# Altium integrated library JMU智能车专用2.0.6.IntLib: 50 symbols
Pins are listed as number, name and electrical type; pins without a type are passive.

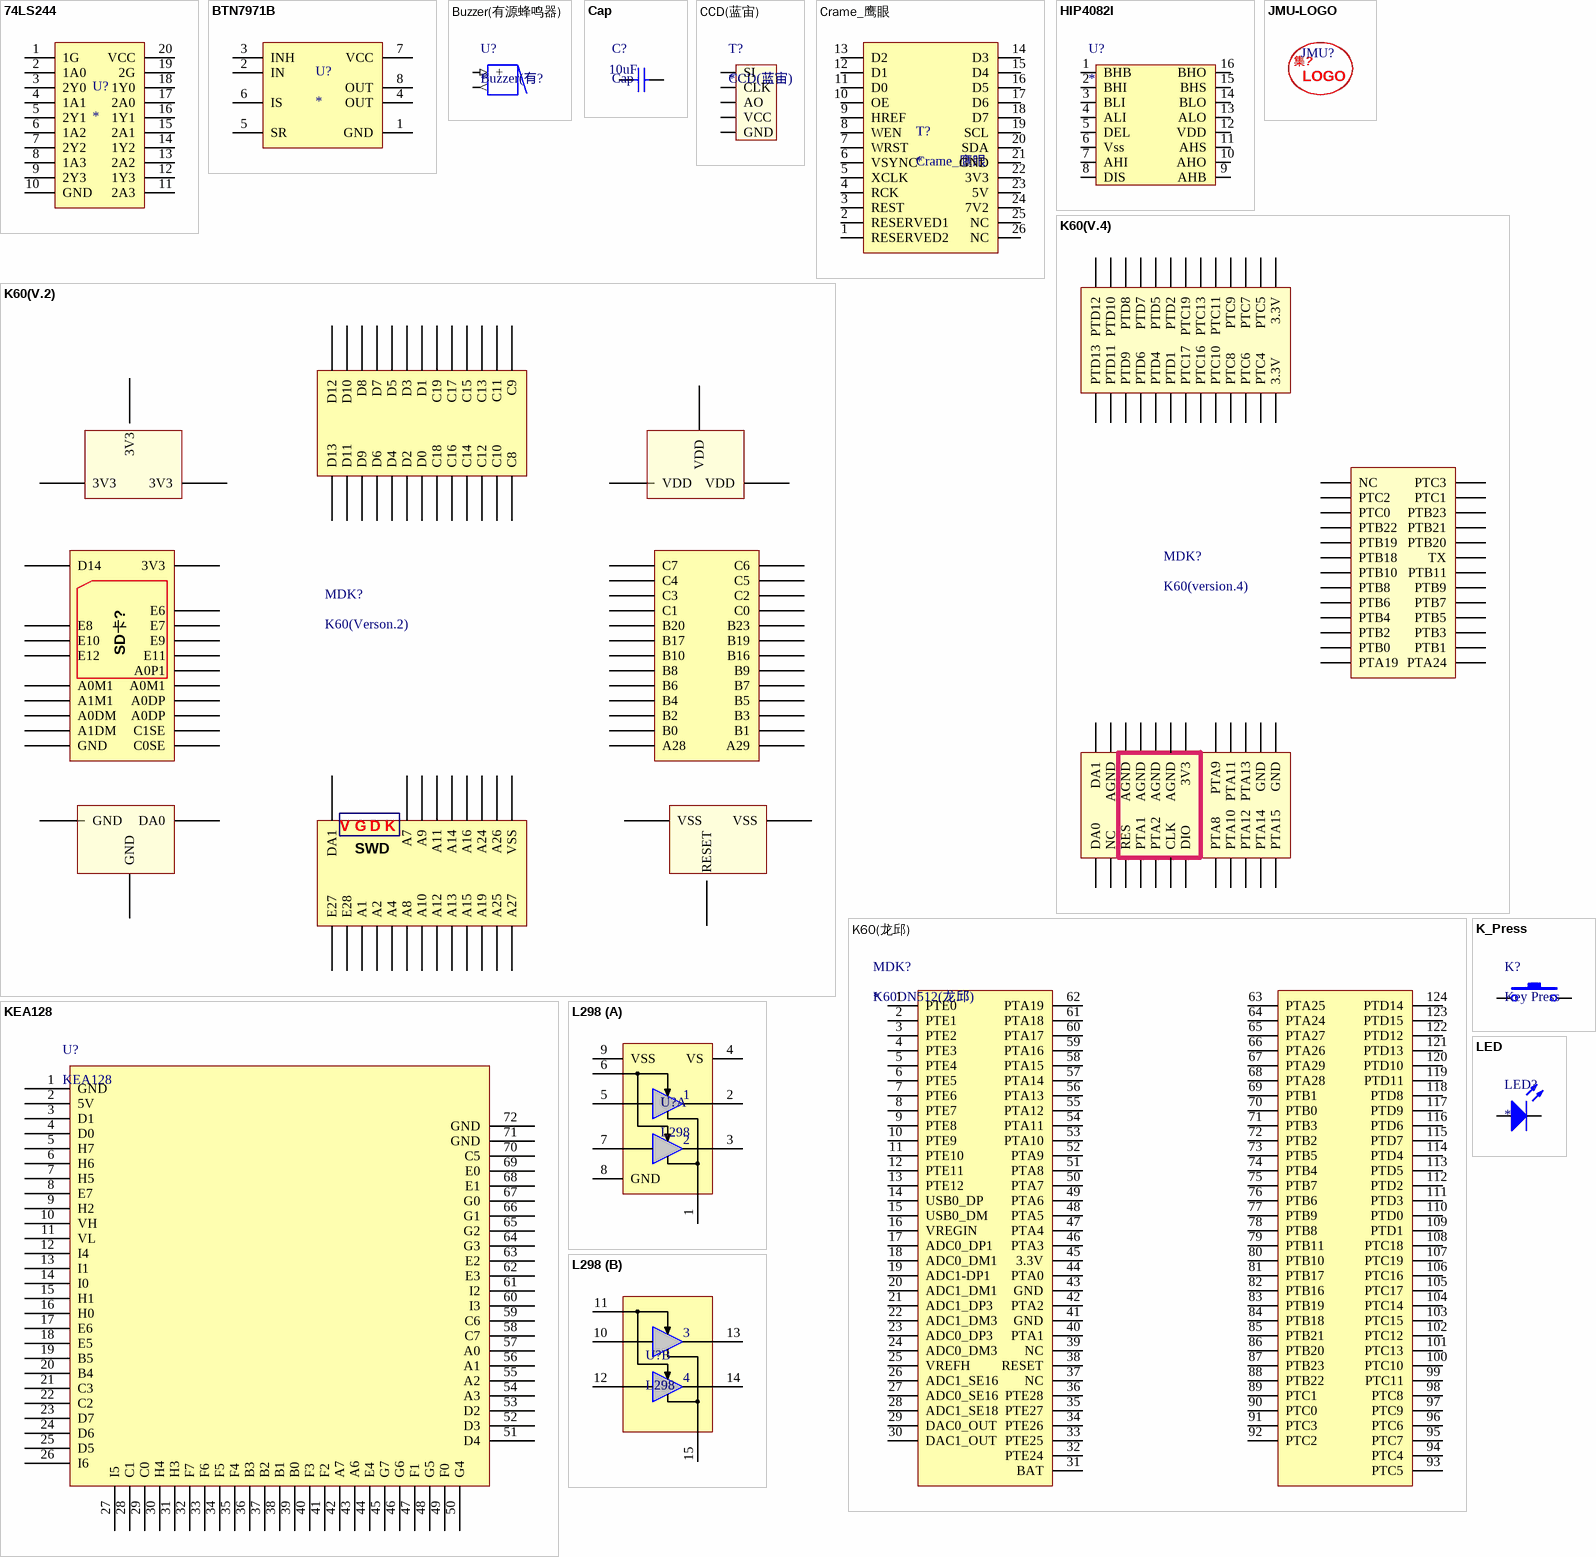
[diagram p0: symbols 74LS244 to LED]

## 74LS244
designator U?
footprint 74LS244D (SOP-20)
footprint 74LS244(中体)
pins: 1 1G, 2 1A0, 3 2Y0, 4 1A1, 5 2Y1, 6 1A2, 7 2Y2, 8 1A3, 9 2Y3, 10 GND, 11 2A3, 12 1Y3, 13 2A2, 14 1Y2, 15 2A1, 16 1Y1, 17 2A0, 18 1Y0, 19 2G, 20 VCC

## BTN7971B
designator U?
电机驱动
footprint BTN7971
pins: 1 GND, 2 IN, 3 INH, 4 OUT, 5 SR, 6 IS, 7 VCC, 8 OUT

## Buzzer(有源蜂鸣器)
designator U?
footprint Buzzer
pins: 1 + (in), 2 (out)
text: Buzzer(有?

## Cap
designator C?  value 10uF
无极电容
footprint 0805
pins: 1, 2

## CCD(蓝宙)
designator T?  C: CCD(蓝宙)
footprint CCD(蓝宙转接板)
pins: 1 SI (power), 2 CLK (power), 3 AO (power), 4 VCC (power), 5 GND (power)

## Crame_鹰眼
designator T?  C: Crame_鹰眼
footprint FFC/SM0.5-2H24
pins: 1 RESERVED2, 2 RESERVED1, 3 REST, 4 RCK, 5 XCLK, 6 VSYNC, 7 WRST, 8 WEN, 9 HREF, 10 OE, 11 D0, 12 D1, 13 D2, 14 D3, 15 D4, 16 D5, 17 D6, 18 D7, 19 SCL, 20 SDA, 21 GND, 22 3V3, 23 5V, 24 7V2, 25 NC, 26 NC

## HIP4082I
designator U?
footprint HIP4082I
pins: 1 BHB, 2 BHI, 3 BLI, 4 ALI, 5 DEL, 6 Vss, 7 AHI, 8 DIS, 9 AHB, 10 AHO, 11 AHS, 12 VDD, 13 ALO, 14 BLO, 15 BHS, 16 BHO

## JMU-LOGO
designator JMU?, comment LOGO(JMU)  (value not drawn)
footprint JMU_logo（1）
footprint JMU_logo（2）
text: 集?; LOGO

## K60(V.2)
designator MDK?, comment K60(Verson.2)
footprint K60(V.2)
pins: 1 D14, 4 E8, 5 E10, 6 E12, 7 A0M1, 8 A1M1, 9 A0DM, 10 A1DM, 11 GND, 12 3V3, 14 E6, 15 E7, 16 E9, 17 E11, 18 A0P1, 19 A0M1, 20 A0DP, 21 A0DP, 22 C1SE, 23 C0SE, 24 GND, 26 E27, 27 E28, 28 A1, 29 A2, 30 A4, 31 A8, 32 A10, 33 A12, 34 A13, 35 A15, 36 A19, 37 A25, 38 A27, 39 RESET, 40 GND, 41 DA0, 43 DA1, 48 A7, 49 A9, 50 A11, 51 A14, 52 A16, 53 A24, 54 A26, 55 VSS, 56 VSS, 57 VSS, 58 A29, 59 B1, 60 B3, 61 B5, 62 B7, 63 B9, 64 B16, 65 B19, 66 B23, 67 C0, 68 C2, 69 C5, 70 C6, 71 A28, 72 B0, 73 B2, 74 B4, 75 B6, 76 B8, 77 B10, 78 B17, 79 B20, 80 C1, 81 C3, 82 C4, 83 C7, 84 3V3, 85 3V3, 86 D13, 87 D11, 88 D9, 89 D6, 90 D4, 91 D2, 92 D0, 93 C18, 94 C16, 95 C14, 96 C12, 97 C10, 98 C8, 99 VDD, 100 VDD, 101 3V3, 102 D12, 103 D10, 104 D8, 105 D7, 106 D5, 107 D3, 108 D1, 109 C19, 110 C17, 111 C15, 112 C13, 113 C11, 114 C9, 115 VDD
text: SD卡?; V; G; D; K; SWD

## K60(V.4)
designator MDK?, comment K60(version.4)
default part:UART0 SWD/JTAG  LQ_OLED
footprint K60(V.4)
pins: 1 DA0 (power), 2 DA1 (power), 3 NC (power), 4 AGND (power), 5 RES (power), 6 AGND (power), 7 PTA1 (power), 8 AGND (power), 9 PTA2 (power), 10 AGND (power), 11 DIO (power), 12 3V3 (power), 13 PTA8 (power), 14 PTA9 (power), 15 PTA10 (power), 16 PTA11 (power), 17 PTA12 (power), 18 PTA13 (power), 19 PTA14 (power), 20 GND (power), 21 PTA15 (power), 22 GND (power), 23 PTA19 (power), 24 PTA24 (power), 25 PTB0 (power), 26 PTB1 (power), 27 PTB2 (power), 28 PTB3 (power), 29 PTB4 (power), 30 PTB5 (power), 31 PTB6 (power), 32 PTB7 (power), 33 PTB8 (power), 34 PTB9 (power), 35 PTB10 (power), 36 PTB11 (power), 37 PTB18 (power), 38 TX (power), 39 PTB19 (power), 40 PTB20 (power), 41 PTB22 (power), 42 PTB21 (power), 43 PTC0 (power), 44 PTB23 (power), 45 PTC2 (power), 46 PTC1 (power), 47 NC (power), 48 PTC3 (power), 49 3.3V (power), 50 3.3V (power), 51 PTC4 (power), 52 PTC5 (power), 53 PTC6 (power), 54 PTC7 (power), 55 PTC8 (power), 56 PTC9 (power), 57 PTC10 (power), 58 PTC11 (power), 59 PTC16 (power), 60 PTC13 (power), 61 PTC17 (power), 62 PTC19 (power), 63 PTD1 (power), 64 PTD2 (power), 65 PTD4 (power), 66 PTD5 (power), 67 PTD6 (power), 68 PTD7 (power), 69 PTD9 (power), 70 PTD8 (power), 71 PTD11 (power), 72 PTD10 (power), 73 PTD13 (power), 74 PTD12 (power), 75 CLK (power), 76 AGND (power)

## K60(龙邱)
designator MDK?  C: K60DN512(龙邱)
footprint K60(龙邱)
pins: 1 PTE0, 2 PTE1, 3 PTE2, 4 PTE3, 5 PTE4, 6 PTE5, 7 PTE6, 8 PTE7, 9 PTE8, 10 PTE9, 11 PTE10, 12 PTE11, 13 PTE12, 14 USB0_DP, 15 USB0_DM, 16 VREGIN, 17 ADC0_DP1, 18 ADC0_DM1, 19 ADC1-DP1, 20 ADC1_DM1, 21 ADC1_DP3, 22 ADC1_DM3, 23 ADC0_DP3, 24 ADC0_DM3, 25 VREFH, 26 ADC1_SE16, 27 ADC0_SE16, 28 ADC1_SE18, 29 DAC0_OUT, 30 DAC1_OUT, 31 BAT, 32 PTE24, 33 PTE25, 34 PTE26, 35 PTE27, 36 PTE28, 37 NC, 38 RESET, 39 NC, 40 PTA1, 41 GND, 42 PTA2, 43 GND, 44 PTA0, 45 3.3V, 46 PTA3, 47 PTA4, 48 PTA5, 49 PTA6, 50 PTA7, 51 PTA8, 52 PTA9, 53 PTA10, 54 PTA11, 55 PTA12, 56 PTA13, 57 PTA14, 58 PTA15, 59 PTA16, 60 PTA17, 61 PTA18, 62 PTA19, 63 PTA25, 64 PTA24, 65 PTA27, 66 PTA26, 67 PTA29, 68 PTA28, 69 PTB1, 70 PTB0, 71 PTB3, 72 PTB2, 73 PTB5, 74 PTB4, 75 PTB7, 76 PTB6, 77 PTB9, 78 PTB8, 79 PTB11, 80 PTB10, 81 PTB17, 82 PTB16, 83 PTB19, 84 PTB18, 85 PTB21, 86 PTB20, 87 PTB23, 88 PTB22, 89 PTC1, 90 PTC0, 91 PTC3, 92 PTC2, 93 PTC5, 94 PTC4, 95 PTC7, 96 PTC6, 97 PTC9, 98 PTC8, 99 PTC11, 100 PTC10, 101 PTC13, 102 PTC12, 103 PTC15, 104 PTC14, 105 PTC17, 106 PTC16, 107 PTC19, 108 PTC18, 109 PTD1, 110 PTD0, 111 PTD3, 112 PTD2, 113 PTD5, 114 PTD4, 115 PTD7, 116 PTD6, 117 PTD9, 118 PTD8, 119 PTD11, 120 PTD10, 121 PTD13, 122 PTD12, 123 PTD15, 124 PTD14

## K_Press
designator K?, comment Key Press
贴片按键
footprint K_Press
pins: 1, 2

## KEA128
designator U?
footprint LQFP80
pins: 1 GND, 2 5V, 3 D1, 4 D0, 5 H7, 6 H6, 7 H5, 8 E7, 9 H2, 10 VH, 11 VL, 12 I4, 13 I1, 14 I0, 15 H1, 16 H0, 17 E6, 18 E5, 19 B5, 20 B4, 21 C3, 22 C2, 23 D7, 24 D6, 25 D5, 26 I6, 27 I5, 28 C1, 29 C0, 30 H4, 31 H3, 32 F7, 33 F6, 34 F5, 35 F4, 36 B3, 37 B2, 38 B1, 39 B0, 40 F3, 41 F2, 42 A7, 43 A6, 44 E4, 45 G7, 46 G6, 47 F1, 48 G5, 49 F0, 50 G4, 51 D4, 52 D3, 53 D2, 54 A3, 55 A2, 56 A1, 57 A0, 58 C7, 59 C6, 60 I3, 61 I2, 62 E3, 63 E2, 64 G3, 65 G2, 66 G1, 67 G0, 68 E1, 69 E0, 70 C5, 71 GND, 72 GND

## L298
designator U?
footprint L298
part A pins: 1 SENSEA, 2 OUT1, 3 OUT2, 4 VS, 5 IN1, 6 ENA, 7 IN2, 8 GND, 9 VSS
part B pins: 10 IN3, 11 ENB, 12 IN4, 13 OUT3, 14 OUT4, 15 SENSEB

## LED
designator LED?
发光二极管
footprint LED(0805)
pins: 1 A, 2 K

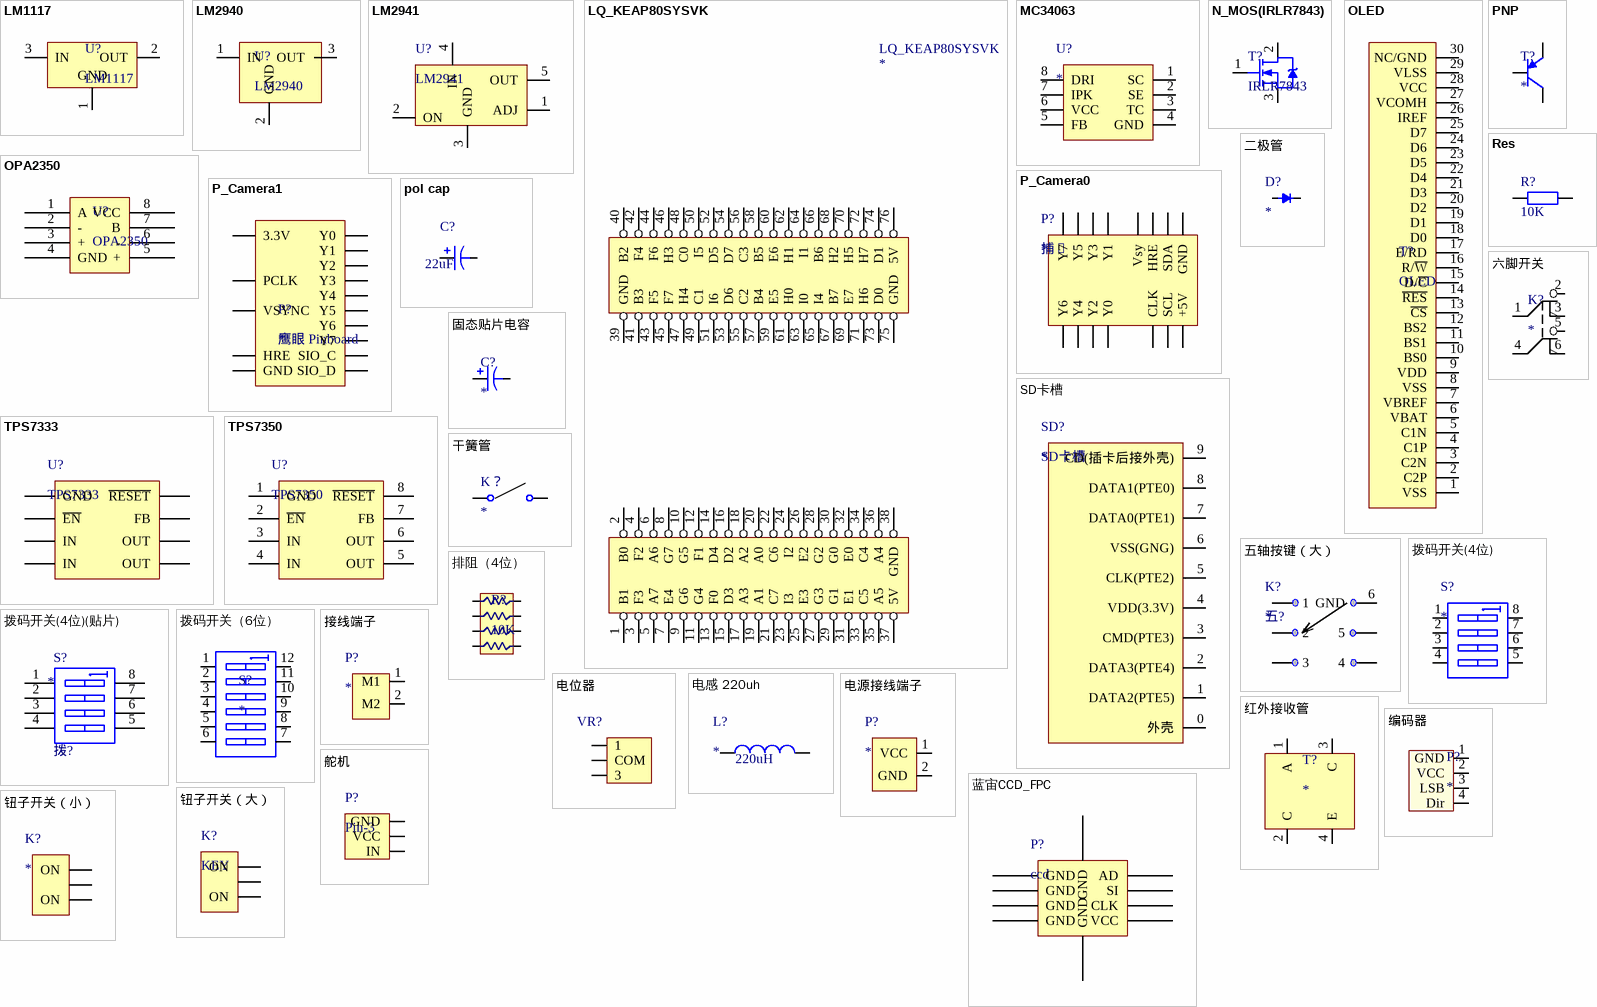
[diagram p1: symbols LM1117 to 钮子开关（小）]

## LM1117
designator U?
footprint AMS117
pins: 1 GND (power), 2 OUT (power), 3 IN (power)

## LM2940
designator U?
OUT--5V
footprint LM2940
pins: 1 IN, 2 GND, 3 OUT

## LM2941
designator U?
稳压元件-->6V
footprint LM2941
pins: 1 ADJ, 2 ON, 3 GND, 4 IN, 5 OUT

## LQ_KEAP80SYSVK
designator LQ_KEAP80SYSVK
LQ_KEAP80SYSVK
footprint LQ_KEAP80SYSVK
pins: 1 B1, 2 B0, 3 F3, 4 F2, 5 A7, 6 A6, 7 E4, 8 G7, 9 G6, 10 G5, 11 G4, 12 F1, 13 F0, 14 D4, 15 D3, 16 D2, 17 A3, 18 A2, 19 A1, 20 A0, 21 C7, 22 C6, 23 I3, 24 I2, 25 E3, 26 E2, 27 G3, 28 G2, 29 G1, 30 G0, 31 E1, 32 E0, 33 C5, 34 C4, 35 A5, 36 A4, 37 5V, 38 GND, 39 GND, 40 B2, 41 B3, 42 F4, 43 F5, 44 F6, 45 F7, 46 H3, 47 H4, 48 C0, 49 C1, 50 I5, 51 I6, 52 D5, 53 D6, 54 D7, 55 C2, 56 C3, 57 B4, 58 B5, 59 E5, 60 E6, 61 H0, 62 H1, 63 I0, 64 I1, 65 I4, 66 B6, 67 B7, 68 H2, 69 E7, 70 H5, 71 H6, 72 H7, 73 D0, 74 D1, 75 GND, 76 5V
text: http://longqiu.taobao.com/

## MC34063
designator U?
footprint MA34063 (12V升压)
pins: 1 SC, 2 SE, 3 TC, 4 GND, 5 FB, 6 VCC, 7 IPK, 8 DRI

## N_MOS(IRLR7843)
designator T?, comment IRLR7843
footprint IRLR7843(MOS)
pins: 1 G, 2 D, 3 S

## OLED
designator T?
footprint OLED
pins: 1 VSS, 2 C2P, 3 C2N, 4 C1P, 5 C1N, 6 VBAT, 7 VBREF, 8 VSS, 9 VDD, 10 BS0, 11 BS1, 12 BS2, 13 ~{CS}, 14 ~{RES}, 15 D/~{C}, 16 R/~{W}, 17 E/RD, 18 D0, 19 D1, 20 D2, 21 D3, 22 D4, 23 D5, 24 D6, 25 D7, 26 IREF, 27 VCOMH, 28 VCC, 29 VLSS, 30 NC/GND

## OPA2350
designator U?
运放芯片
footprint SOIC-8
pins: 1 A, 2 -, 3 +, 4 GND, 5 +, 6 -, 7 B, 8 VCC

## P_Camera0
designator P?
捕食者Pinboard
footprint 捕食者PinBoard
footprint 捕食者PinBoard
pins: 1 Y7, 2 Y5, 3 Y3, 4 Y1, 6 Vsy, 7 HRE, 8 SDA, 9 GND, 11 Y6, 12 Y4, 13 Y2, 14 Y0, 17 CLK, 18 SCL, 19 +5V
text: 捕�

## P_Camera1
designator P?
鹰眼 Pinboard; C: 鹰眼 Pinboard
footprint 鹰眼Pin_Board
pins: 1 3.3V, 4 PCLK, 6 VSYNC, 9 HRE, 10 GND, 11 SIO_D, 12 SIO_C, 13 Y7, 14 Y6, 15 Y5, 16 Y4, 17 Y3, 18 Y2, 19 Y1, 20 Y0

## PNP
designator T?
footprint PNP
pins: 1 C, 2 B, 3 E

## pol cap
designator C?  value 22uF  (hidden comment: pol cap)
通用有极电容
footprint pol cap(10uF)
footprint Pol Cap(220uF)
pins: 1, 2

## Res
designator R?, comment 10K
通用电阻; Value: 10K
footprint 0805
footprint 0603
pins: 1, 2

## SD卡槽
designator SD?  C: SD卡槽
SD卡槽-SDHC(FOR K60)
footprint SD卡槽
pins: 0 外壳, 1 DATA2(PTE5), 2 DATA3(PTE4), 3 CMD(PTE3), 4 VDD(3.3V), 5 CLK(PTE2), 6 VSS(GNG), 7 DATA0(PTE1), 8 DATA1(PTE0), 9 CD(插卡后接外壳)

## TPS7333
designator U?
稳压元件（3.3V）
footprint SOIC-8
pins: 1 GND (power), 2 ~{EN} (power), 3 IN (power), 4 IN (power), 5 OUT (power), 6 OUT (power), 7 FB (power), 8 ~{RESET} (power)

## TPS7350
designator U?
稳压元件（5V）
footprint SOIC-8
pins: 1 GND (power), 2 ~{EN} (power), 3 IN (power), 4 IN (power), 5 OUT (power), 6 OUT (power), 7 FB (power), 8 ~{RESET} (power)

## 二极管
designator D?
footprint 二极管
pins: 1 +, 2 -

## 五轴按键（大）
designator K?
footprint 五向按键（大）
pins: 1, 2, 3, 4, 5, 6 GND
text: 五?

## 六脚开关
designator K?
按钮开关
footprint 按钮开关
pins: 1 (power), 2 (power), 3 (power), 4 (power), 5 (power), 6 (power)

## 固态贴片电容
designator C?
ED8:470UF  ED6.3:100UF
footprint ED6.3
footprint ED8
pins: 1, 2

## 干簧管
designator K？
footprint 干簧管
pins: 1, 2

## 拨码开关(4位)
designator S?
拨码开关（4位）
footprint 拨码开关*4
pins: 1 A1, 2 A2, 3 A3, 4 A4, 5 B4, 6 B3, 7 B2, 8 B1

## 拨码开关(4位)(贴片)
designator S?
拨码开关（4位）
footprint Switch_4P
pins: 1 A1, 2 A2, 3 A3, 4 A4, 5 B4, 6 B3, 7 B2, 8 B1
text: 拨?

## 拨码开关（6位）
designator S?
footprint 拨码开关*6
pins: 1 A1, 2 A2, 3 A3, 4 A4, 5 A5, 6 A5, 7 B5, 8 B5, 9 B4, 10 B3, 11 B2, 12 B1

## 排阻（4位）
designator R?, comment 10K
排阻（4位）
footprint 排阻（4位）
pins: 1, 2, 3, 4, 5, 6, 7, 8

## 接线端子
designator P?
footprint 接线端子
pins: 1 M1, 2 M2

## 电位器
designator VR?, comment 5K  (value not drawn)
footprint HDR_1X3
pins: 1, 2 COM, 3

## 电感 220uh
designator L?  value 220uH
7*7*4
footprint 电感（220uh）
pins: 1, 2

## 电源接线端子
designator P?
电源线
footprint T型接头
footprint 电源接线端子
pins: 1 VCC, 2 GND

## 红外接收管
designator T?
footprint TCR5000
footprint ST188
pins: 1 A, 2 C, 3 C, 4 E

## 编码器
designator P?
footprint 编码器
pins: 1 GND (power), 2 VCC (power), 3 LSB (power), 4 Dir (power)

## 舵机
designator P?, comment Pin-3
舵机...
footprint HDR_1X3
pins: 1 IN, 2 VCC, 3 GND

## 蓝宙CCD_FPC
designator P?, comment ccd
footprint FPC8-0.5(蓝宙CCD)
pins: 1 VCC, 2 GND, 3 CLK, 4 GND, 5 SI, 6 GND, 7 AD, 8 GND, 9 GND, 10 GND

## 钮子开关（大）
designator K?, comment KEY
AC 250V/6A
footprint 钮子开关（大）
pins: 1 ON, 2 com, 3 ON

## 钮子开关（小）
designator K?
AC 125V /3A
footprint 钮子开关(小)
pins: 1 ON, 2 com, 3 ON